# Altium integrated library Mechanical.IntLib: 5 symbols
Pins are listed as number, name and electrical type; pins without a type are passive.

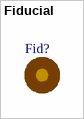
[diagram p0: symbol Fiducial]

## Fiducial
designator Fid?  (value not drawn)  (graphical)
Fiducial; Component Category: Mechanical; Component Type: Fiducial
footprint Fiducial - 2mm, 5mm
footprint Fiducial, Panel - 2mm, 5mm
footprint Fiducial - 2mm, 5mm (SON)


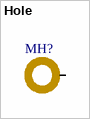
[diagram p1: symbol Hole]

## Hole
designator MH?  (value not drawn)  (graphical)
Mounting Hole; Component Category: Mechanical; Component Type: Mounting Hole
footprint Mounting Hole - Hole-3.2mm, Pad-5mm (Mounting Hole, Hole-3.2mm, Pad-5mm)
pins: Hole


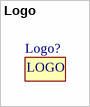
[diagram p2: symbol Logo]

## Logo
designator Logo?  (value not drawn)  (graphical)
Logo; Component Category: Mechanical; Component Type: Logo
footprint Logo 1 (Logo)
text: LOGO


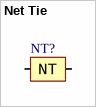
[diagram p3: symbol Net Tie]

## Net Tie
designator NT?  (value not drawn)  (mechanical)
Mechanical, Net Tie, 1mm; Component Type: Test Point; Component Category: Mechanical; ComponentLink1Description: Datasheet; ComponentLink1URL: E:\Altium\Datasheets\Mechanical\Net Ties and How to Use Them.pdf
footprint Net Tie - 1mm
pins: 1, 2
text: NT


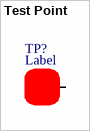
[diagram p4: symbol Test Point]

## Test Point
designator TP?  (value not drawn)  (graphical)
Test Point; Component Category: Mechanical; Component Type: Test Point; Label: Label
footprint Test Point - SMD, Circular, Diameter-1mm (SMD, Circular, Diameter-1mm)
footprint Test Point - TH, Circular, Diameter-1mm, Pad-2mm (TH, Circular, Diameter-1mm, Pad-2mm)
pins: TP Test Point